# Altium footprint library connector.PcbLib: 138 footprints (part 1 of 9)
Each footprint in its own frame and in the unit in brackets; x right, y up, seen from the top. Pads: shape width x height; smd on the part's side, far side on the other; paste and mask are expansions set on the pad; w line width, h text height; cw(c..) or ccw(c..) is an arc to the next point about the centre after c.
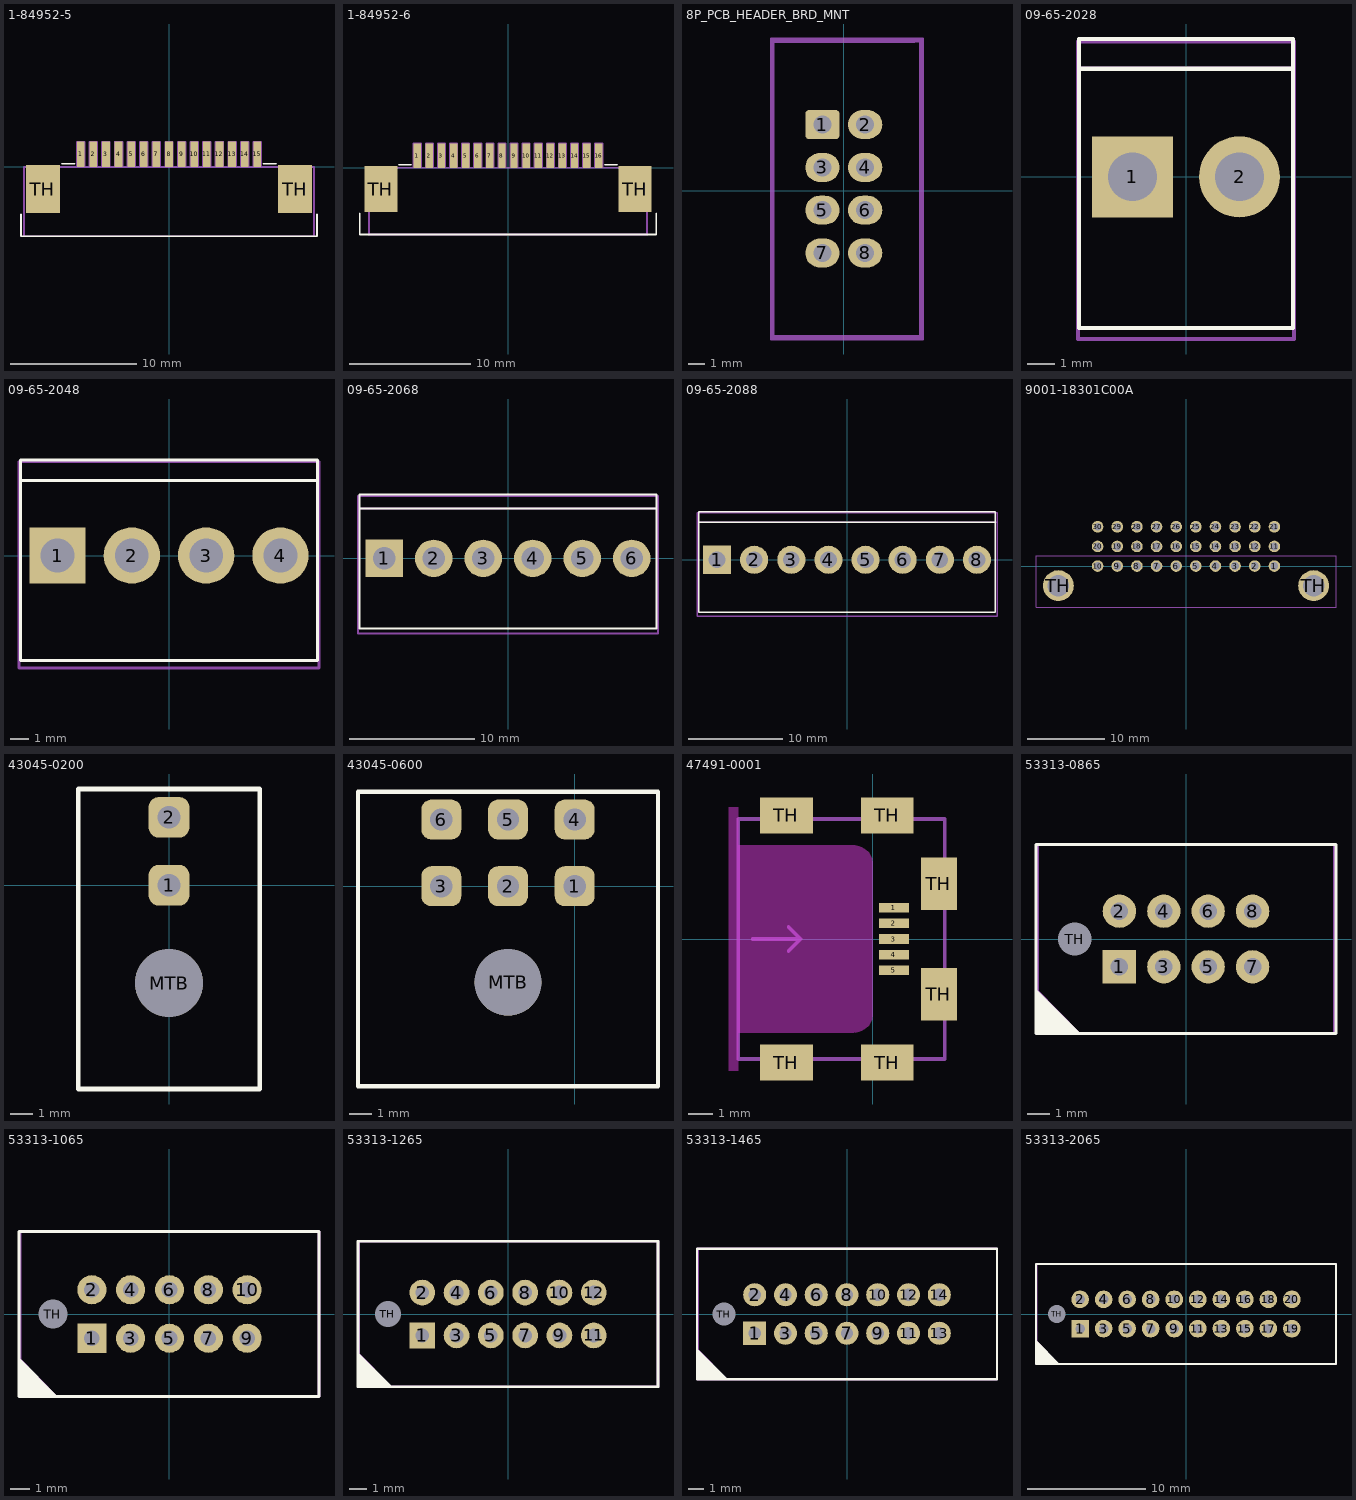
[diagram p0: the footprints below, top view; thin cyan lines are the x and y axes]

## 1-84952-5 [mm]
height 2.6
pads (17):
  rect 0.61x2 smd: 1(-7,1) 2(-6,1) 3(-5,1) 4(-4,1) 5(-3,1) 6(-2,1) 7(-1,1) 8(0,1) 9(1,1) 10(2,1) 11(3,1) 12(4,1) 13(5,1) 14(6,1) 15(7,1)
  rect 2.7x3.8 smd: TH(-10,-1.75) TH(10,-1.75)
Top Overlay:
  lines w0.15: -11.75,-3.75 -11.75,-5.5 0.5,-5.5 11.75,-5.5 11.75,-3.75 ; -8.5,0.25 -7.5,0.25 ; 7.5,0.25 8.5,0.25
Mechanical 29:
  lines w0.15: -7.3,0 -7.3,2 -6.7,2 -6.7,0 ; -6.3,0 -6.3,2 -5.7,2 -5.7,0 ; -5.3,0 -5.3,2 -4.7,2 -4.7,0 ; -4.3,0 -4.3,2 -3.7,2 -3.7,0 ; -3.3,0 -3.3,2 -2.7,2 -2.7,0 ; -2.3,0 -2.3,2 -1.7,2 -1.7,0 ; -1.3,0 -1.3,2 -0.7,2 -0.7,0 ; -0.3,0 -0.3,2 0.3,2 0.3,0 ; 0.7,0 0.7,2 1.3,2 1.3,0 ; 1.7,0 1.7,2 2.3,2 2.3,0 ; 2.7,0 2.7,2 3.3,2 3.3,0 ; 3.7,0 3.7,2 4.3,2 4.3,0 ; 4.7,0 4.7,2 5.3,2 5.3,0 ; 5.7,0 5.7,2 6.3,2 6.3,0 ; 6.7,0 6.7,2 7.3,2 7.3,0 ; -11.5,-5.5 -11.5,0 11.5,0 11.5,-5.5 -11.5,-5.5
  text ".Designator" at -3,-2.3 h1

## 1-84952-6 [mm]
height 2.6
pads (18):
  rect 0.61x2 smd: 1(-7.5,1) 2(-6.5,1) 3(-5.5,1) 4(-4.5,1) 5(-3.5,1) 6(-2.5,1) 7(-1.5,1) 8(-0.5,1) 9(0.5,1) 10(1.5,1) 11(2.5,1) 12(3.5,1) 13(4.5,1) 14(5.5,1) 15(6.5,1) 16(7.5,1)
  rect 2.7x3.8 smd: TH(-10.5,-1.75) TH(10.5,-1.75)
Top Overlay:
  lines w0.15: -12.25,-3.75 -12.25,-5.5 0.5,-5.5 12.25,-5.5 12.25,-3.75 ; -9,0.25 -8,0.25 ; 8,0.25 9,0.25
Mechanical 29:
  lines w0.15: -7.8,0 -7.8,2 -7.2,2 -7.2,0 ; -6.8,0 -6.8,2 -6.2,2 -6.2,0 ; -5.8,0 -5.8,2 -5.2,2 -5.2,0 ; -4.8,0 -4.8,2 -4.2,2 -4.2,0 ; -3.8,0 -3.8,2 -3.2,2 -3.2,0 ; -2.8,0 -2.8,2 -2.2,2 -2.2,0 ; -1.8,0 -1.8,2 -1.2,2 -1.2,0 ; -0.8,0 -0.8,2 -0.2,2 -0.2,0 ; 0.2,0 0.2,2 0.8,2 0.8,0 ; 1.2,0 1.2,2 1.8,2 1.8,0 ; 2.2,0 2.2,2 2.8,2 2.8,0 ; 3.2,0 3.2,2 3.8,2 3.8,0 ; 4.2,0 4.2,2 4.8,2 4.8,0 ; 5.2,0 5.2,2 5.8,2 5.8,0 ; 6.2,0 6.2,2 6.8,2 6.8,0 ; 7.2,0 7.2,2 7.8,2 7.8,0 ; -11.5,-5.5 11.5,-5.5 11.5,0 -11.5,0 -11.5,-5.5
  text ".Designator" at -2.5,-2.3 h1

## 8P_PCB_HEADER_BRD_MNT [mil] "HEADER BRD MNT 8POS 2.54MM"
height 393.7
pads (8):
  rrect25% 80x68 hole 42: 1(-50,155)
  oval 80x68 hole 42: 2(50,155) 3(-50,55) 4(50,55) 5(-50,-45) 6(50,-45) 7(-50,-145) 8(50,-145)
Mechanical 15:
  lines w5.91: -170,-346 -170,355 185,355 185,-346 -170,-346
Mechanical 29:
  circle w5.91: c-50,155 r21.83
  circle w5.91: c50,155 r21.83
  circle w5.91: c-50,55 r21.83
  circle w5.91: c50,55 r21.83
  circle w5.91: c50,-45 r21.83
  circle w5.91: c50,-145 r21.83
  circle w5.91: c-50,-145 r21.83
  circle w5.91: c-50,-45 r21.83
  circle w5.91: c-50,55 r21.83
  lines w5.91: -160,-340 165,-340 ; -160,349 165,349 ; -166.34,-339.57 179.13,-339.57 179.13,350.39 -166.34,350.39 -166.34,-339.57 ; -165,-340 -165,350 180,350 180,-340 -165,-340
  text ".Designator" at -118.11,263.78 h39.37
3D body "User Library-8 pin IDC shrouded header V2.step": height 361.42, standoff -116.93, extent -176.18,-344.09 186.02,355.91

## 09-65-2028 [mm]
pads (2):
  rect 3x3 hole 1.8: 1(-1.98,0)
  round 3 hole 1.8: 2(1.98,0)
Top Overlay:
  lines w0.15: -3.96,4 3.96,4 ; -3.96,-5.6 3.96,-5.6 3.96,5.1 -3.96,5.1 -3.96,-5.6
Mechanical 29:
  lines w0.15: -4,4 4,4 ; -4,-6 -4,5 4,5 4,-6 -4,-6
  text ".Designator" at -3.5,-0.3 h1
3D body "009652028.stp": height 13.85, standoff -3.6, extent -3.58,-5.6 3.58,5.15

## 09-65-2048 [mm]
height 12
pads (4):
  rect 3x3 hole 1.8: 1(-5.94,0)
  round 3 hole 1.8: 2(-1.98,0) 3(1.98,0) 4(5.94,0)
Top Overlay:
  lines w0.15: -7.92,4 7.92,4 ; -7.92,-5.6 -7.92,5.1 7.92,5.1 7.92,-5.6 -7.92,-5.6
Mechanical 29:
  lines w0.15: 8,4 -8,4 -8,5 ; -8,5 -8,-6 8,-6 8,5 -8,5
  text ".Designator" at -3.5,-0.8 h1
3D body "009652048.stp": height 13.85, standoff -3.6, extent -7.515,-5.6 7.565,5.15

## 09-65-2068 [mm]
pads (6):
  rect 3x3 hole 1.8: 1(-9.9,0)
  round 3 hole 1.8: 2(-5.94,0) 3(-1.98,0) 4(1.98,0) 5(5.94,0) 6(9.9,0)
Top Overlay:
  lines w0.15: -11.88,4 11.88,4 ; -11.88,-5.6 11.88,-5.6 11.88,5.1 -11.88,5.1 -11.88,-5.6
Mechanical 29:
  lines w0.15: 12,4 -12,4 -12,5 ; -12,5 12,5 12,-6 -12,-6 -12,5
  text ".Designator" at -3.5,-0.3 h1
3D body "009652068.stp": height 13.85, standoff -3.6, extent -11.5,-5.6 11.5,5.15

## 09-65-2088 [mm]
pads (8):
  rect 3x3 hole 1.8: 1(-13.86,0)
  round 3 hole 1.8: 2(-9.9,0) 3(-5.94,0) 4(-1.98,0) 5(1.98,0) 6(5.94,0) 7(9.9,0) 8(13.86,0)
Top Overlay:
  lines w0.15: -15.84,4 15.84,4 ; -15.84,-5.6 -15.84,5.1 15.84,5.1 15.84,-5.6 -15.84,-5.6
Mechanical 29:
  lines w0.15: 16,4 -16,4 -16,5 ; -16,5 -16,-6 16,-6 16,5 -16,5
  text ".Designator" at -2,0.2 h1
3D body "009652088.stp": height 13.85, standoff -3.6, extent -15.46,-5.6 15.46,5.15

## 9001-18301C00A [mm]
height 9
pads (32):
  round 1.5 hole 1: 1(11.43,0) 2(8.89,0) 3(6.35,0) 4(3.81,0) 5(1.27,0) 6(-1.27,0) 7(-3.81,0) 8(-6.35,0) 9(-8.89,0) 10(-11.43,0) 11(11.43,2.54) 12(8.89,2.54) 13(6.35,2.54) 14(3.81,2.54) 15(1.27,2.54) 16(-1.27,2.54) 17(-3.81,2.54) 18(-6.35,2.54) 19(-8.89,2.54) 20(-11.43,2.54) 21(11.43,5.08) 22(8.89,5.08) 23(6.35,5.08) 24(3.81,5.08) 25(1.27,5.08) 26(-1.27,5.08) 27(-3.81,5.08) 28(-6.35,5.08) 29(-8.89,5.08) 30(-11.43,5.08)
  round 4 hole 2.8: TH(-16.51,-2.54) TH(16.51,-2.54)
Mechanical 29:
  lines w0.15: -19.4,-5.3 -19.4,1.3 19.4,1.3 19.4,-5.3 -19.4,-5.3
  text ".Designator" at -5.5,-2.8 h1
3D body "0925_DIN_Type_3C_angled_male_30_pole.stp": height 9.35, standoff -3, extent -19.35,-12.639 19.35,5.38

## 43045-0200 [mm] "Molex, Micro-Fit 3.0™ Right Angle Header, 3.00mm Pitch, Dual Row, 2 Circuits, with Snap-in Plastic Peg PCB Lock, Tin, Glow Wire Capable, Black"
height 8.77
pads (3):
  rrect50% 1.8x1.8 hole 1: 1(0,0) 2(0,3)
  round 3 hole 3 unplated: MTB(0,-4.32)
Top Overlay:
  lines w0.2: -4,-9 4,-9 4,4.25 -4,4.25 -4,-9
3D body "430450200.stp": height 8.77, standoff -3.18, extent -3.575,-8.92 3.575,3.32

## 43045-0600 [mm] "Molex, Micro-Fit 3.0™ Right Angle Header, 3.00mm Pitch, Dual Row, 6 Circuits, with Snap-in Plastic Peg PCB Lock, Tin, Glow Wire Capable, Black"
height 8.77
pads (7):
  rrect50% 1.8x1.8 hole 1: 1(0,0) 2(-3,0) 3(-6,0) 4(0,3) 5(-3,3) 6(-6,3)
  round 3 hole 3 unplated: MTB(-3,-4.325)
Top Overlay:
  lines w0.2: -9.75,-9 -9.75,4.25 3.75,4.25 3.75,-9 -9.75,-9
3D body "430450600.stp": height 8.77, standoff -3.18, extent -9.575,-8.92 3.575,3.32

## 47491-0001 [mm]
pads (11):
  rect 1.25x0.4 smd: 1(0.875,1.3) 2(0.875,0.65) 3(0.875,0) 4(0.875,-0.65) 5(0.875,-1.3)
  rect 2.2x1.5 smd: TH(-3.6,-5.15) TH(-3.6,5.15) TH(0.6,-5.15) TH(0.6,5.15)
  rect 1.5x2.2 smd: TH(2.75,-2.3) TH(2.75,2.3)
Keep-Out Layer:
  board cut-out: -6,-5.5 -6,5.5 -5.6,5.5 -5.6,3.9 -0.8,3.9 -0.721,3.9 -0.567,3.869 -0.421,3.809 -0.29,3.721 -0.179,3.61 -0.091,3.479 -0.031,3.333 0,3.179 0,3.1 0,-3.1 0,-3.179 -0.031,-3.333 -0.091,-3.479 -0.179,-3.61 -0.29,-3.721 -0.421,-3.809 -0.567,-3.869 -0.721,-3.9 -0.8,-3.9 -5.6,-3.9 -5.6,-5.5
Mechanical 29:
  lines w0.15: -5,0 -3,0 ; -3.5,-0.5 -3,0 ; -3.5,0.5 -3,0 ; -5.6,-5 -5.6,5 3,5 3,-5 -5.6,-5
  text ".Designator" at -4.5,2.7 h1
3D body "474910001.stp": height 1.47, standoff -1.47, extent -5.905,-5.5 3.225,5.5

## 53313-0865 [mm]
height 7
pads (9):
  rect 1.5x1.5 hole 0.8: 1(-3,-1.25)
  round 1.5 hole 0.8: 2(-3,1.25) 3(-1,-1.25) 4(-1,1.25) 5(1,-1.25) 6(1,1.25) 7(3,-1.25) 8(3,1.25)
  round 1 hole 1.5: TH(-5,0)
Top Overlay:
  region: -6.75,-2.25 -6.75,-4.25 -4.75,-4.25
  lines w0.15: -6.75,-4.25 6.75,-4.25 6.75,4.25 -6.75,4.25 -6.75,-4.25
Mechanical 29:
  region: -6.7,-2.257 -6.7,-4.25 -4.764,-4.25
  lines w0.15: -6.7,-4.25 -6.7,4.25 6.7,4.25 6.7,-4.25 -6.7,-4.25
  text ".Designator" at -3,-0.3 h1
3D body "533130865.stp": height 6.75, standoff -3.25, extent -6.7,-4.25 6.7,4.25

## 53313-1065 [mm]
height 7
pads (11):
  rect 1.5x1.5 hole 0.8: 1(-4,-1.25)
  round 1.5 hole 0.8: 2(-4,1.25) 3(-2,-1.25) 4(-2,1.25) 5(0,-1.25) 6(0,1.25) 7(2,-1.25) 8(2,1.25) 9(4,-1.25) 10(4,1.25)
  round 1 hole 1.5: TH(-6,0)
Top Overlay:
  region: -7.75,-2.25 -7.75,-4.25 -5.75,-4.25
  lines w0.15: -7.75,-4.25 -7.75,4.25 7.7,4.25 7.7,-4.25 -7.75,-4.25
Mechanical 29:
  region: -7.7,-2.257 -7.7,-4.25 -5.764,-4.25
  lines w0.15: -7.7,-4.25 7.7,-4.25 7.7,4.25 -7.7,4.25 -7.7,-4.25
  text ".Designator" at -3,-0.3 h1
3D body "533131065.stp": height 6.75, standoff -3.25, extent -7.7,-4.25 7.7,4.25

## 53313-1265 [mm]
pads (13):
  rect 1.5x1.5 hole 0.8: 1(-5,-1.25)
  round 1.5 hole 0.8: 2(-5,1.25) 3(-3,-1.25) 4(-3,1.25) 5(-1,-1.25) 6(-1,1.25) 7(1,-1.25) 8(1,1.25) 9(3,-1.25) 10(3,1.25) 11(5,-1.25) 12(5,1.25)
  round 1 hole 1.5: TH(-7,0)
Top Overlay:
  region: -8.75,-2.25 -8.75,-4.25 -6.75,-4.25
  lines w0.15: -8.75,-4.25 8.75,-4.25 8.75,4.25 -8.75,4.25 -8.75,-4.25
Mechanical 29:
  region: -8.7,-2.257 -8.7,-4.25 -6.764,-4.25
  lines w0.15: -8.7,-4.25 -8.7,4.25 8.75,4.25 8.75,-4.25 -8.7,-4.25
  text ".Designator" at -3,-0.3 h1
3D body "533131265.stp": height 6.75, standoff -3.25, extent -8.7,-4.25 8.7,4.25

## 53313-1465 [mm]
height 7
pads (15):
  rect 1.5x1.5 hole 0.8: 1(-6,-1.25)
  round 1.5 hole 0.8: 2(-6,1.25) 3(-4,-1.25) 4(-4,1.25) 5(-2,-1.25) 6(-2,1.25) 7(0,-1.25) 8(0,1.25) 9(2,-1.25) 10(2,1.25) 11(4,-1.25) 12(4,1.25) 13(6,-1.25) 14(6,1.25)
  round 1 hole 1.5: TH(-8,0)
Top Overlay:
  region: -9.75,-2.25 -9.75,-4.25 -7.75,-4.25
  lines w0.15: -9.75,-4.25 9.75,-4.25 9.75,4.25 -9.75,4.25 -9.75,-4.25
Mechanical 29:
  region: -9.7,-2.257 -9.7,-4.25 -7.764,-4.25
  lines w0.15: -9.7,-4.25 -9.7,4.25 9.75,4.25 9.75,-4.25 -9.7,-4.25
  text ".Designator" at -3.5,-0.3 h1
3D body "533131465.stp": height 6.75, standoff -3.25, extent -9.7,-4.25 9.7,4.25

## 53313-2065 [mm]
height 7
pads (21):
  rect 1.5x1.5 hole 0.8: 1(-9,-1.25)
  round 1.5 hole 0.8: 2(-9,1.25) 3(-7,-1.25) 4(-7,1.25) 5(-5,-1.25) 6(-5,1.25) 7(-3,-1.25) 8(-3,1.25) 9(-1,-1.25) 10(-1,1.25) 11(1,-1.25) 12(1,1.25) 13(3,-1.25) 14(3,1.25) 15(5,-1.25) 16(5,1.25) 17(7,-1.25) 18(7,1.25) 19(9,-1.25) 20(9,1.25)
  round 1 hole 1.5: TH(-11,0)
Top Overlay:
  region: -12.75,-2.25 -12.75,-4.25 -10.75,-4.25
  lines w0.15: -12.75,-4.25 -12.75,4.25 12.75,4.25 12.75,-4.25 -12.75,-4.25
Mechanical 29:
  region: -12.7,-2.257 -12.7,-4.25 -10.764,-4.25
  lines w0.15: -12.7,-4.25 12.75,-4.25 12.75,4.25 -12.7,4.25 -12.7,-4.25
  text ".Designator" at -3.5,-0.3 h1
3D body "533132065.stp": height 6.75, standoff -3.25, extent -12.65,-4.25 12.75,4.25